# Altium footprint library B38.PcbLib: 42 footprints (part 3 of 3)
Each footprint in its own frame and in the unit in brackets; x right, y up, seen from the top. Pads: shape width x height; smd on the part's side, far side on the other; paste and mask are expansions set on the pad; w line width, h text height; cw(c..) or ccw(c..) is an arc to the next point about the centre after c.
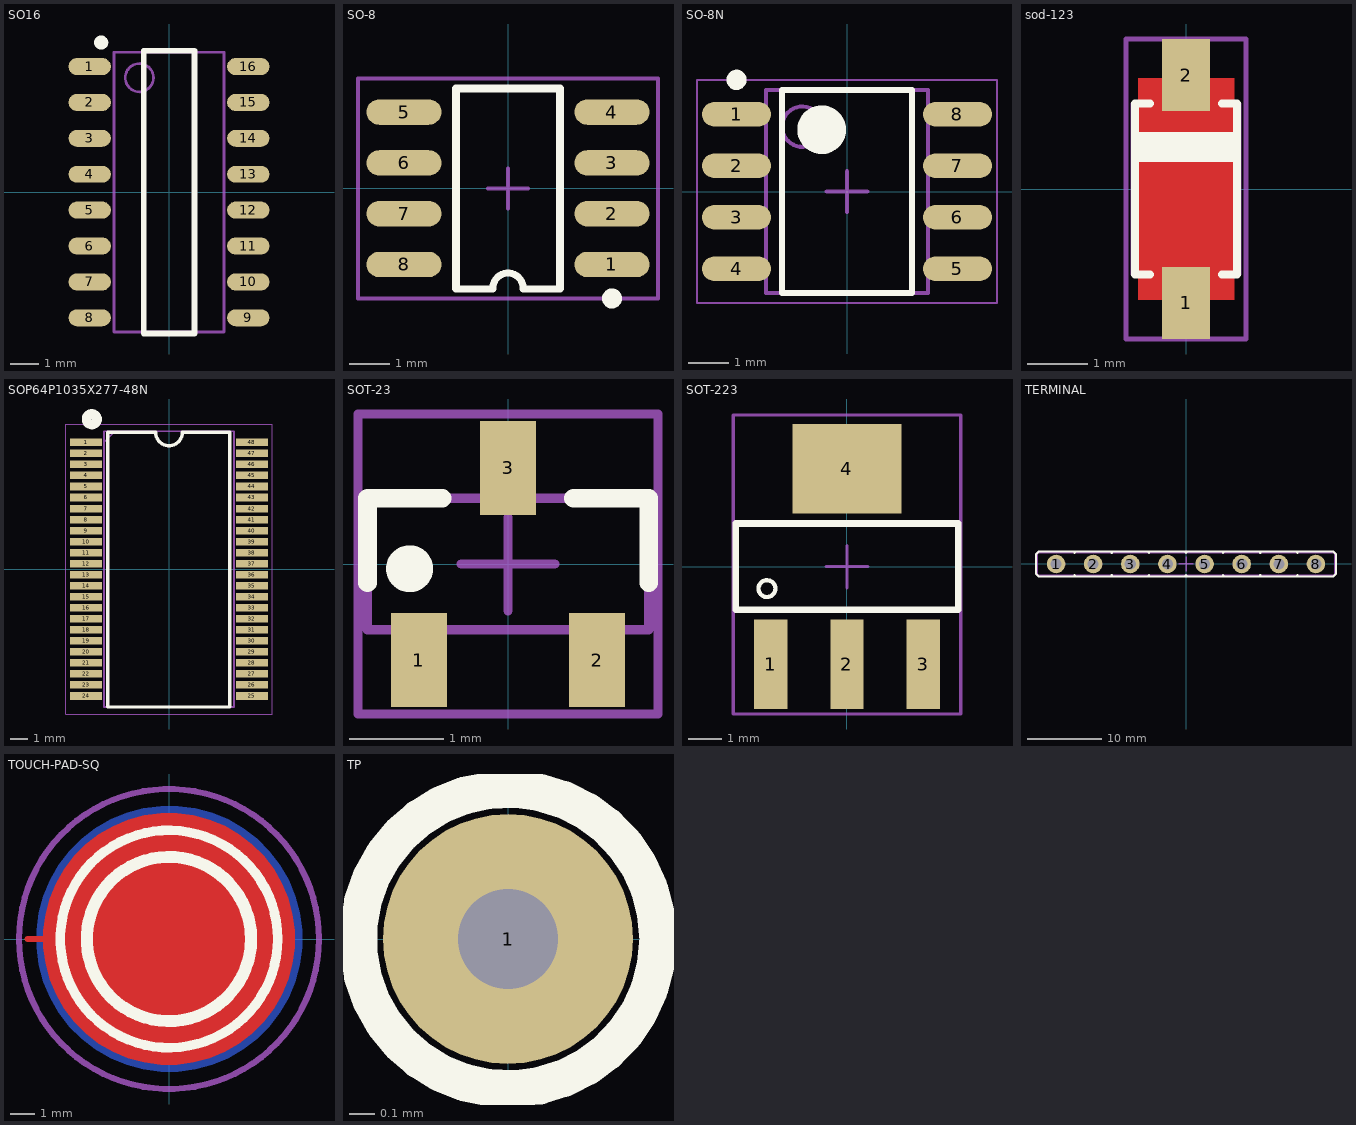
[diagram p2: the footprints below, top view; thin cyan lines are the x and y axes]

## SO16 [mm]
pads (16):
  oval 1.5x0.6 smd: 1(-2.806,4.445) 2(-2.806,3.175) 3(-2.806,1.905) 4(-2.806,0.635) 5(-2.806,-0.635) 6(-2.806,-1.905) 7(-2.806,-3.175) 8(-2.806,-4.445) 9(2.805,-4.445) 10(2.805,-3.175) 11(2.805,-1.905) 12(2.805,-0.635) 13(2.805,0.635) 14(2.805,1.905) 15(2.805,3.175) 16(2.805,4.445)
Top Overlay:
  circle w0.25: c-2.4,5.295 r0.125
  lines w0.2: -0.9,-5 0.9,-5 0.9,5 -0.9,5 -0.9,-5
Mechanical 13:
  circle w0.1: c-1.05,4.05 r0.5
  lines w0.1: -1.95,-4.95 1.95,-4.95 1.95,4.95 -1.95,4.95 -1.95,-4.95
3D body "User Library-so16.STEP": height 1.7, standoff 0, extent -3.051,-5.125 2.949,5.075

## SO-8 [mm]
pads (8):
  oval 1.88x0.635 smd: 1(2.6,-1.905) 2(2.6,-0.635) 3(2.6,0.635) 4(2.6,1.905) 5(-2.6,1.905) 6(-2.6,0.635) 7(-2.6,-0.635) 8(-2.6,-1.905)
Top Overlay:
  circle w0.25: c2.6,-2.755 r0.125
  lines w0.178: -1.3,-2.515 -0.381,-2.515 ; -0.381,-2.5 cw(c0,-2.5) 0.381,-2.5 ; 0.381,-2.515 1.27,-2.515
  lines w0.2: -1.3,-2.5 -1.3,2.5 1.3,2.5 1.3,-2.5
Mechanical 15:
  lines w0.1: -0.5,0 0.5,0 ; 0,-0.5 0,0.5 ; -3.75,-2.75 3.75,-2.75 3.75,2.75 -3.75,2.75 -3.75,-2.75
3D body "SO-8.STEP": height 1.7, standoff 0.1, extent -2.995,-2.45 2.995,2.45

## SO-8N [mm] "SOIC, 8-Leads, Body 4/89x3/90mm, Pitch 1/27mm, IPC Medium Density designer:abbas basereh"
height 1.5
pads (8):
  oval 1.7x0.6 smd mask+0.06: 1(-2.725,1.905) 2(-2.725,0.635) 3(-2.725,-0.635) 4(-2.725,-1.905) 5(2.725,-1.905) 6(2.725,-0.635) 7(2.725,0.635) 8(2.725,1.905)
Top Overlay:
  circle w0.6: c-0.625,1.525 r0.3
  circle w0.25: c-2.725,2.755 r0.125
  lines w0.15: -1.6,-2.5 1.6,-2.5 1.6,2.5 -1.6,2.5 -1.6,-2.5
Mechanical 13:
  circle w0.1: c-1.1,1.6 r0.5
  lines w0.1: -2,-2.5 2,-2.5 2,2.5 -2,2.5 -2,-2.5
Mechanical 15:
  lines w0.05: -3.7,-2.75 3.7,-2.75 3.7,2.75 -3.7,2.75 -3.7,-2.75
  lines w0.1: -0.5,0 0.5,0 ; 0,-0.5 0,0.5
3D body "SOIC127P600X150-8N.step": height 1.5, standoff 0, extent -3,-2.5 3,2.5

## sod-123 [mm] "SOD-123; 2 Leads; Body 2.7 x 1.6 mm, (LxW)"
height 1.35
pads (2):
  rect 0.8x1.2 smd: 1(0,-1.9) 2(0,1.9)
Top Layer:
  pour cut-out: -0.8,1.849 0.8,1.849 0.8,-1.849 -0.8,-1.849
Top Overlay:
  region: -0.85,0.95 -0.85,0.45 0.85,0.45 0.85,0.95
  lines w0.127: -0.6,-1.425 -0.85,-1.425 -0.85,1.425 -0.6,1.425 ; 0.6,-1.425 0.85,-1.425 0.85,1.425 0.6,1.425
Mechanical 13:
  lines w0.05: -0.308,-1.766 0.308,-1.766 ; -0.308,-1.707 0.308,-1.707 ; -0.308,-1.517 0.308,-1.517 ; -0.308,-1.425 -0.308,-1.95 0.308,-1.95 0.308,-1.425 ; -0.308,1.425 -0.308,1.95 0.308,1.95 0.308,1.425 ; -0.308,1.517 0.308,1.517 ; -0.308,1.707 0.308,1.707 ; -0.308,1.766 0.308,1.766 ; -0.9,-1.425 -0.9,1.425 ; -0.9,-1.425 -0.797,-1.322 ; -0.9,-1.425 0.9,-1.425 ; -0.9,1.425 0.9,1.425 ; -0.9,1.425 -0.798,1.323 ; -0.797,-1.322 -0.798,1.072 -0.798,1.323 ; -0.797,-1.322 0.797,-1.322 ; -0.798,1.323 0.798,1.323 ; 0.797,-1.322 0.9,-1.425 ; 0.797,-1.322 0.798,1.072 0.798,1.323 ; 0.798,1.323 0.9,1.425 ; 0.9,-1.425 0.9,1.425
Mechanical 15:
  lines w0.076: -1,-2.5 1,-2.5 1,2.5 -1,2.5 -1,-2.5
  lines w0.2: -0.35,0 0.35,0 ; 0,-0.35 0,0.35
3D body "User Library-SOD-123.STEP": height 1.25, standoff 0, extent -0.8,-1.849 0.8,1.849

## SOP64P1035X277-48N [mm]
pads (48):
  rect 1.85x0.435 smd: 1(-4.775,7.302) 2(-4.775,6.668) 3(-4.775,6.032) 4(-4.775,5.398) 5(-4.775,4.762) 6(-4.775,4.128) 7(-4.775,3.492) 8(-4.775,2.858) 9(-4.775,2.222) 10(-4.775,1.588) 11(-4.775,0.952) 12(-4.775,0.318) 13(-4.775,-0.318) 14(-4.775,-0.952) 15(-4.775,-1.588) 16(-4.775,-2.222) 17(-4.775,-2.858) 18(-4.775,-3.492) 19(-4.775,-4.128) 20(-4.775,-4.762) 21(-4.775,-5.398) 22(-4.775,-6.032) 23(-4.775,-6.668) 24(-4.775,-7.302) 25(4.775,-7.302) 26(4.775,-6.668) 27(4.775,-6.032) 28(4.775,-5.398) 29(4.775,-4.762) 30(4.775,-4.128) 31(4.775,-3.492) 32(4.775,-2.858) 33(4.775,-2.222) 34(4.775,-1.588) 35(4.775,-0.952) 36(4.775,-0.318) 37(4.775,0.318) 38(4.775,0.952) 39(4.775,1.588) 40(4.775,2.222) 41(4.775,2.858) 42(4.775,3.492) 43(4.775,4.128) 44(4.775,4.762) 45(4.775,5.398) 46(4.775,6.032) 47(4.775,6.668) 48(4.775,7.302)
Top Overlay:
  circle w0.56: c-4.445,8.636 r0.3
  lines w0.2: -0.79,7.874 -3.528,7.874 -3.528,-7.937 3.5,-7.937 3.5,7.874 0.762,7.874 cw(c0,7.874) -0.762,7.874
Mechanical 13:
  lines w0.1: -3.746,7.302 -3.112,7.937 ; -3.746,-7.937 3.746,-7.937 3.746,7.937 -3.746,7.937 -3.746,-7.937
Mechanical 15:
  lines w0.05: -5.95,-8.34 5.95,-8.34 5.95,8.34 -5.95,8.34 -5.95,-8.34
3D body "HT1621B_48SSOP_.stp": height 2.77, standoff 0, extent -5.175,-7.937 5.175,7.937

## SOT-23 [mm] "SOT23, 3-Leads, Body 2.9x1.3mm, Pitch 0.95mm, Lead Span 2.4mm, IPC Medium Density"
height 1.14
pads (3):
  rect 0.6x1 smd: 1(-0.95,-1.025) 2(0.95,-1.025) 3(0,1.025)
Top Overlay:
  circle w0.25: c-1.05,-0.05 r0.125
  lines w0.2: -1.5,-0.2 -1.5,0.7 -0.7,0.7 ; 0.7,0.7 1.5,0.7 1.5,-0.2
Mechanical 13:
  lines w0.1: -1.5,-0.7 1.5,-0.7 1.5,0.7 -1.5,0.7 -1.5,-0.7
Mechanical 15:
  lines w0.1: -0.5,0 0.5,0 ; 0,-0.5 0,0.5 ; -1.6,-1.6 1.6,-1.6 1.6,1.6 -1.6,1.6 -1.6,-1.6
3D body "User Library-N-MOS_BSS123_SOT23.STEP": height 1, standoff 0, extent -1.45,-1.225 1.45,1.075

## SOT-223 [mm]
height 1.14
pads (4):
  rect 1x2.7 smd: 1(-2.3,-2.95) 2(0,-2.95) 3(2.3,-2.95)
  rect 3.3x2.7 smd: 4(0,2.95)
Top Overlay:
  circle w0.127: c-2.413,-0.664 r0.254
  lines w0.2: -3.35,-1.3 3.35,-1.3 3.35,1.3 -3.35,1.3 -3.35,-1.3
Mechanical 15:
  lines w0.1: -0.635,0 0.635,0 ; 0,-0.635 0,0.635 ; -3.429,-4.445 3.429,-4.445 3.429,4.572 -3.429,4.572 -3.429,-4.445
3D body "SOT223-3.step": height 1.6, standoff 0, extent -3.261,-3.502 3.239,3.571

## TERMINAL [mm]
pads (8):
  round 2.5 / inner round 2 / far side oval 3x4 hole 1.5 mask+0.051: 1(-17.5,0) 2(-12.5,0) 3(-7.5,0) 4(-2.5,0) 5(2.5,0) 6(7.5,0) 7(12.5,0) 8(17.5,0)
Top Overlay:
  lines w0.3: -15.2,-1.7 -15,-1.5 -14.8,-1.7 ; -15.2,1.7 -15,1.5 -14.8,1.7 ; -10.2,-1.7 -10,-1.5 -9.8,-1.7 ; -10.2,1.7 -10,1.5 -9.8,1.7 ; -5.2,-1.7 -5,-1.5 -4.8,-1.7 ; -5.2,1.7 -5,1.5 -4.8,1.7 ; -0.2,-1.7 0,-1.5 0.2,-1.7 ; -0.2,1.7 0,1.5 0.2,1.7 ; 4.8,-1.7 5,-1.5 5.2,-1.7 ; 4.8,1.7 5,1.5 5.2,1.7 ; 9.8,-1.7 10,-1.5 10.2,-1.7 ; 9.8,1.7 10,1.5 10.2,1.7 ; 14.8,-1.7 15,-1.5 15.2,-1.7 ; 14.8,1.7 15,1.5 15.2,1.7 ; -20.2,-1.3 -19.8,-1.7 19.8,-1.7 20.2,-1.3 20.2,1.3 19.8,1.7 -19.8,1.7 -20.2,1.3 -20.2,-1.3
Mechanical 15:
  lines w0.2: -1,0 1,0 ; 0,-1 0,1 ; -20,-1.5 20,-1.5 20,1.5 -20,1.5 -20,-1.5
3D body: height 2.1, standoff 0, extent -5,-1.4 0,1.4
3D body: height 2.1, standoff 0, extent -10,-1.4 -5,1.4
3D body: height 2.1, standoff 0, extent -15,-1.4 -10,1.4
3D body: height 2.1, standoff 0, extent -20,-1.4 -15,1.4
3D body: height 2.1, standoff 0, extent 0,-1.4 5,1.4
3D body: height 2.1, standoff 0, extent 5,-1.4 10,1.4
3D body: height 2.1, standoff 0, extent 10,-1.4 15,1.4
3D body: height 2.1, standoff 0, extent 15,-1.4 20,1.4
3D body: height 9.1, standoff -3.4, extent -18.145,-0.649 -16.85,0.649
3D body: height 9.1, standoff -3.4, extent -13.145,-0.649 -11.85,0.649
3D body: height 9.1, standoff -3.4, extent -8.145,-0.649 -6.85,0.649
3D body: height 9.1, standoff -3.4, extent -3.145,-0.649 -1.85,0.649
3D body: height 9.1, standoff -3.4, extent 1.855,-0.649 3.15,0.649
3D body: height 9.1, standoff -3.4, extent 6.855,-0.649 8.15,0.649
3D body: height 9.1, standoff -3.4, extent 11.855,-0.649 13.15,0.649
3D body: height 9.1, standoff -3.4, extent 16.855,-0.649 18.15,0.649

## TOUCH-PAD-SQ [mm]
height 1.35
Top Layer:
  pour cut-out: -5.2,0 -5.2,0.341 -5.112,1.017 -4.936,1.675 -4.676,2.305 -4.335,2.896 -3.921,3.437 -3.439,3.919 -2.899,4.335 -2.309,4.676 -1.679,4.937 -1.021,5.114 -0.345,5.204 0.337,5.204 1.013,5.116 1.671,4.94 2.301,4.68 2.892,4.339 3.433,3.925 3.915,3.443 4.331,2.903 4.672,2.313 4.933,1.683 5.11,1.025 5.2,0.349 5.2,0.008 5.2,0 5.2,-0.341 5.11,-1.017 4.933,-1.675 4.672,-2.304 4.331,-2.894 3.915,-3.435 3.433,-3.917 2.892,-4.331 2.301,-4.671 1.671,-4.932 1.013,-5.108 0.337,-5.196 -0.345,-5.196 -1.021,-5.106 -1.679,-4.929 -2.309,-4.668 -2.899,-4.326 -3.439,-3.911 -3.921,-3.429 -4.335,-2.887 -4.676,-2.297 -4.936,-1.667 -5.112,-1.008 -5.2,-0.332 -5.2,0.008
  lines w0.254: -5.85,0 0,0 ; -5.85,0 0,0 ; -5.85,0 0,0 ; -5.85,0 0,0 ; -5.85,0 0,0 ; -5.85,0 0,0 ; -5.85,0 0,0 ; -5.85,0 0,0 ; -5.85,0 0,0 ; -5.85,0 0,0 ; -5.85,0 0,0 ; -5.85,0 0,0 ; -5.85,0 0,0 ; -5.85,0 0,0 ; -5.85,0 -5.582,0 -5.51,0 -5.383,0 -5.311,0 -5.235,0 -5.036,0 -1.5,0 0,0
  lines w4: -1.5,0 cw(c0,0) 0,1.5 cw(c0,0) -1.5,0
Bottom Layer:
  pour cut-out: -5.48,0.008 -5.48,0.369 -5.386,1.083 -5.199,1.779 -4.923,2.444 -4.563,3.068 -4.125,3.639 -3.615,4.149 -3.044,4.587 -2.42,4.947 -1.755,5.223 -1.059,5.41 -0.345,5.504 0.376,5.504 1.09,5.41 1.786,5.223 2.451,4.947 3.075,4.587 3.647,4.149 4.156,3.639 4.594,3.068 4.955,2.444 5.23,1.779 5.417,1.083 5.511,0.369 5.511,0.008 5.511,-0.352 5.417,-1.066 5.23,-1.762 4.955,-2.427 4.594,-3.051 4.156,-3.623 3.647,-4.132 3.075,-4.57 2.451,-4.931 1.786,-5.206 1.09,-5.393 0.376,-5.487 -0.345,-5.487 -1.059,-5.393 -1.755,-5.206 -2.42,-4.931 -3.044,-4.57 -3.615,-4.132 -4.125,-3.623 -4.563,-3.051 -4.923,-2.427 -5.199,-1.762 -5.386,-1.066 -5.48,-0.352
  pour cut-out: -4.425,-0.35 -4.446,-0.059 -4.412,0.523 -4.303,1.095 -4.119,1.649 -3.865,2.173 -3.545,2.66 -3.164,3.101 -2.728,3.489 -2.246,3.816 -1.725,4.078 -1.174,4.269 -0.603,4.387 -0.022,4.429 0.56,4.396 1.133,4.286 1.686,4.103 2.211,3.848 2.698,3.528 3.139,3.147 3.526,2.711 3.854,2.229 4.115,1.708 4.307,1.157 4.425,0.586 4.446,0.296 4.467,0.005 4.433,-0.577 4.323,-1.149 4.14,-1.703 3.886,-2.228 3.566,-2.715 3.184,-3.156 2.749,-3.543 2.267,-3.871 1.746,-4.132 1.195,-4.324 0.624,-4.441 0.043,-4.484 -0.539,-4.45 -1.112,-4.34 -1.665,-4.157 -2.19,-3.903 -2.677,-3.582 -3.118,-3.201 -3.506,-2.766 -3.833,-2.283 -4.095,-1.762 -4.286,-1.212 -4.404,-0.641
Top Overlay:
  circle w0.4: c0,0 r4.5
  circle w0.5: c0,0 r3.4
Top Paste:
  lines w0.9: -2.415,-0.647 ccw(c0,0) -0.647,-2.415 ; -2.415,0.647 cw(c0,0) -0.647,2.415 ; 0.647,-2.415 ccw(c0,0) 2.415,-0.647 ; 0.647,2.415 cw(c0,0) 2.415,0.647
Top Solder:
  circle w1: c0,0 r2.5
Mechanical 15:
  circle w0.254: c0,0 r6.21
  lines w0.254: -0.6,0 0.6,0 ; 0,-0.6 0,0.6
3D body "Spring.STEP": height 10.46, standoff -0.05, extent -5.242,-5.036 4.834,4.995

## TP [mm]
height 1.6
pads (1):
  round 1 smd mask+0: 1(0,0)
via 0,0 diameter 0.6 hole 0.4
Top Overlay:
  circle w0.15: c0,0 r0.6